# Altium footprint library 二极管封装库.PcbLib: 222 footprints (part 14 of 14)
Each footprint in its own frame and in the unit in brackets; x right, y up, seen from the top. Pads: shape width x height; smd on the part's side, far side on the other; paste and mask are expansions set on the pad; w line width, h text height; cw(c..) or ccw(c..) is an arc to the next point about the centre after c.
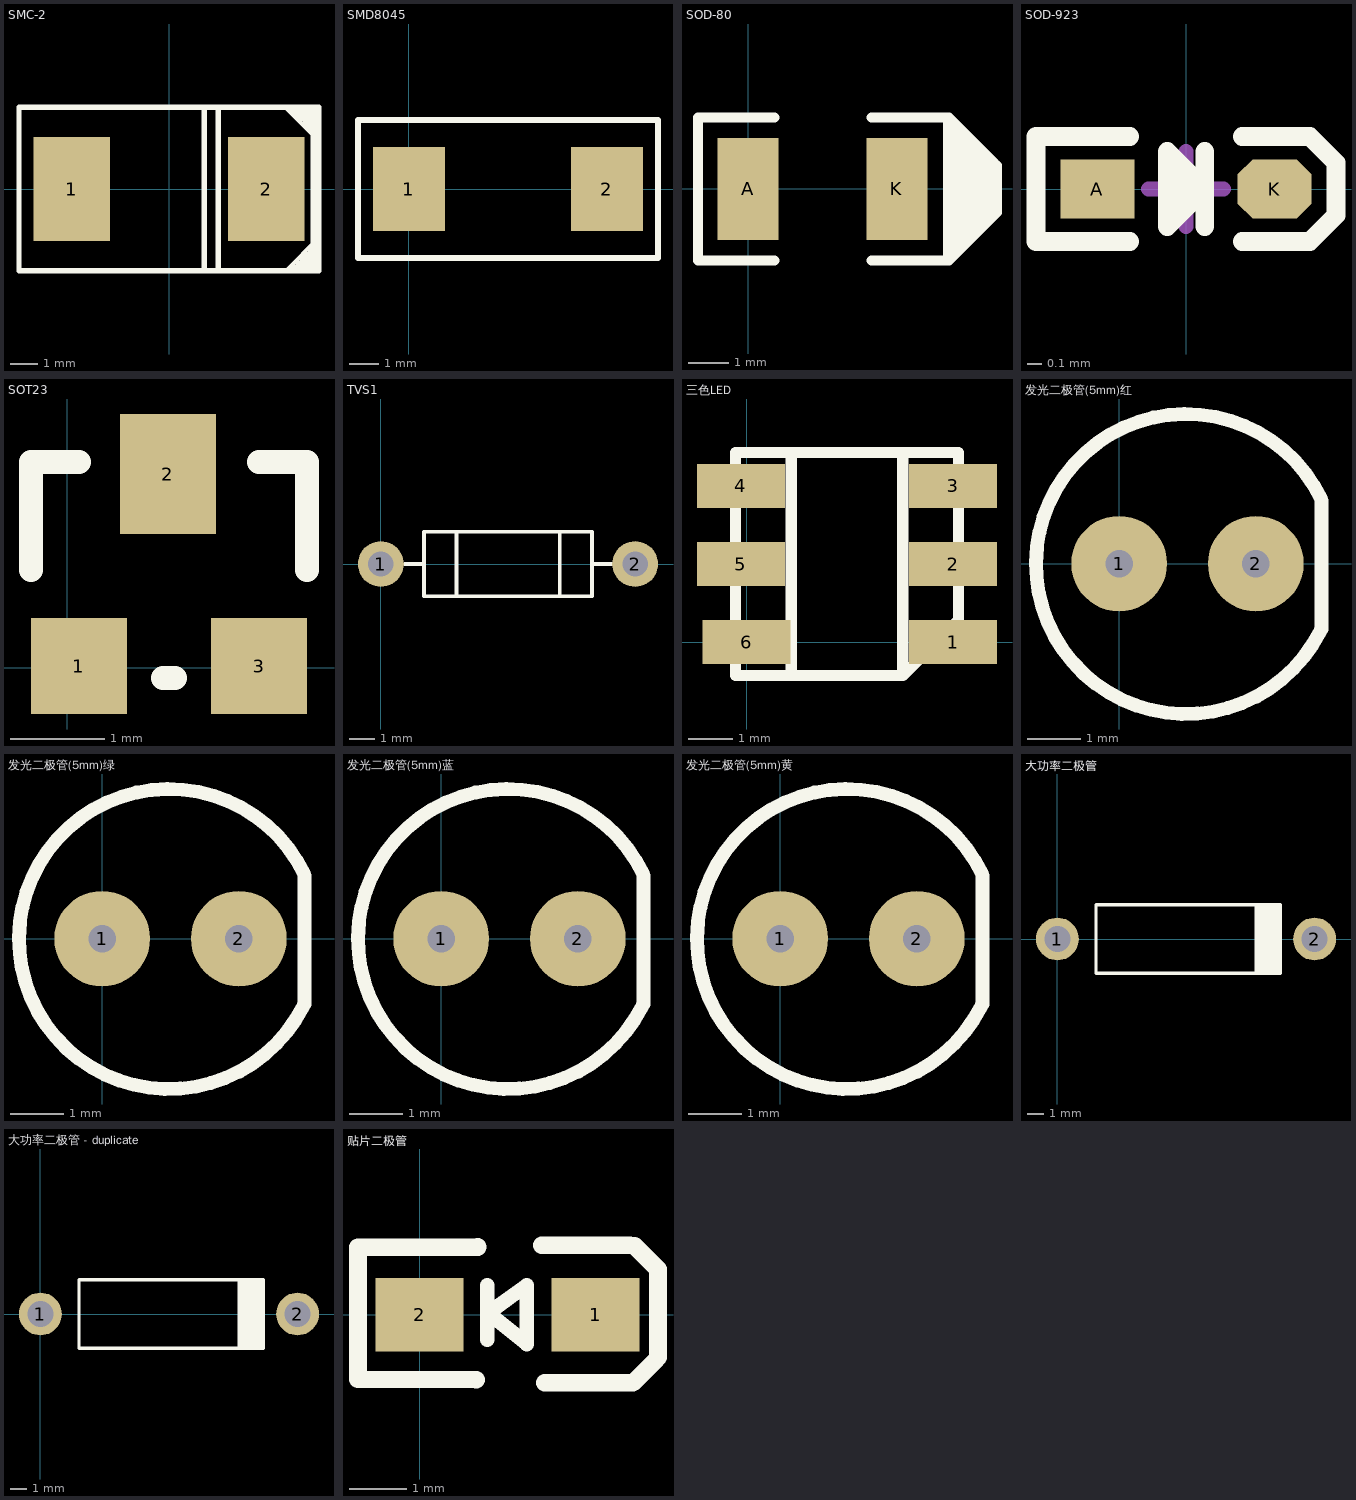
[diagram p13: the footprints below, top view; thin cyan lines are the x and y axes]

## SMC-2 [mil]
pads (2):
  rect 110x150 smd: 1(-140.49,0) 2(140.49,0)
Top Overlay:
  rectangle: 177.87,-116.5 187.76,-108.82
  rectangle: 183.14,-116.06 191.26,-103.56
  rectangle: 194.09,-100.71 204.41,-91.02
  rectangle: 189.39,-115.63 202.44,-97.3
  rectangle: 200.59,-115.63 207.05,-86.1
  rectangle: 201.77,84.37 207.28,90.51
  rectangle: 192.36,93.35 195.87,99.92
  rectangle: 195,89.17 200.47,98.62
  rectangle: 197.64,88.07 208.82,102.56
  rectangle: 182.68,100.59 191.02,110.24
  rectangle: 187.76,97.95 208.15,109.61
  rectangle: 175.43,107.4 209.69,118.11
  rectangle: 203.98,-115.63 214.53,115.08
  lines w5.91: 169.06,116.85 211.22,74.69 ; 169.29,-117.4 215.39,-71.3
  lines w7.87: 50.87,-117.64 50.87,115.98 ; 71.38,-116.53 71.38,116.46 ; -216.53,-118.11 216.53,-118.11 216.53,118.11 -216.53,118.11 -216.53,-118.11

## SMD8045 [mm]
pads (2):
  rect 2.4x2.8 smd: 1(0,0) 2(6.6,0)
Top Overlay:
  lines w0.203: -1.7,-2.3 -1.7,2.3 8.253,2.3 ; -1.653,-2.3 8.3,-2.3 8.3,2.3

## SOD-80 [mil]
pads (2):
  rect 60x100 smd: A(0,0) K(146,0)
Top Overlay:
  rectangle: 218,-38 232,40
  rectangle: 229,19 235.21,31.79
  rectangle: 226,-29 241,26
  rectangle: 205,-52 222,47
  rectangle: 205,-52 214,54
  rectangle: 196,-60 207.99,59.01
  lines w10: 26,-70 -49,-70 -49,70 26,70 ; 121,-70 196,-70 ; 121,70 196,70 ; 241,26 197,70 196,70 ; 244,23 244,-23 197,-70 196,-70 ; 196,-70 196,-67 196,-70 ; 196,-70 196,70

## SOD-923 [mm] "0.8x0.6X0.4mm（长宽高，不包括引脚）"
pads (2):
  rect 0.5x0.4 smd: A(-0.6,0)
  oct 0.5x0.4 smd: K(0.6,0)
Top Overlay:
  lines w0.127: -0.381,-0.356 -1.016,-0.356 -1.016,0.356 -0.381,0.356 ; 0,-0.127 0,0.127 -0.127,0.254 ; 0.127,-0.254 0.127,0.254 ; 0.381,-0.356 0.838,-0.356 1.016,-0.178 1.016,0.178 0.838,0.356 0.381,0.356 ; -0.127,0.254 -0.127,-0.254 0.127,0 -0.127,0.254
Mechanical 15:
  lines w0.1: -0.254,0 0.254,0 ; 0,-0.254 0,0.254
3D body "SOD-923.STEP": height 0.43, standoff 0.03, extent -0.5,-0.3 0.5,0.3

## SOT23 [mil]
pads (3):
  rect 40x40 smd: 1(4.88,0.63) 3(79.88,0.63)
  rect 40x50 smd: 2(41.88,80.63)
Top Overlay:
  lines w10: -15.12,40.63 -15.12,85.63 4.88,85.63 ; 39.88,-4.37 44.88,-4.37 ; 79.88,85.63 99.88,85.63 99.88,40.63
3D body "SOT-23-3.STEP": height 47.24, standoff 0, extent -14.87,-11.02 99.3,99.22

## TVS1 [mm]
pads (2):
  round 1.8 hole 1: 1(0,0) 2(10,0)
Top Overlay:
  lines w0.15: 0.939,0 1.701,0 ; 2.971,-1.27 2.971,1.27 ; 7.035,-1.27 7.035,1.27 ; 8.305,0 9.067,0 ; 1.701,-1.27 1.701,1.27 8.305,1.27 8.305,-1.27 1.701,-1.27
3D body "TVS.STEP": height 2.86, standoff -2.5, extent -0.397,-1.362 10.403,1.362

## 三色LED [mm]
pads (6):
  rect 2x1 smd: 1(4.699,0) 2(4.699,1.778) 3(4.699,3.556) 4(-0.127,3.556) 5(-0.127,1.778) 6(0,0)
Top Overlay:
  lines w0.254: 1.016,-0.762 1.016,4.318 ; 3.556,4.318 3.556,-0.762 ; 3.556,-0.762 4.826,0.508 4.826,4.318 -0.254,4.318 -0.254,-0.762 3.556,-0.762
3D body "User Library-smd_led_5050.step": height 1.6, standoff 0, extent -0.347,-0.697 4.953,4.303

## 发光二极管(5mm)红 [mil]
pads (2):
  round 70 hole 20: 1(0,0) 2(100,0)
Top Overlay:
  lines w10: 147.17,-49.09 cw(c48.9,-0.21) 147.99,46.99 ; 148,-48 148,46
3D body "LED5_RED.STEP": height 338.58, standoff -78.74, extent -62.2,-112.19 148.43,112.2

## 发光二极管(5mm)绿 [mil]
pads (2):
  round 70 hole 20: 1(0,0) 2(100,0)
Top Overlay:
  lines w10: 147.17,-49.09 cw(c48.9,-0.21) 147.99,46.99 ; 148,-48 148,46
3D body "LED5_GRE.STEP": height 338.58, standoff -78.74, extent -62.2,-112.19 148.43,112.2

## 发光二极管(5mm)蓝 [mil]
pads (2):
  round 70 hole 20: 1(0,0) 2(100,0)
Top Overlay:
  lines w10: 147.17,-49.09 cw(c48.9,-0.21) 147.99,46.99 ; 148,-48 148,46
3D body "LED5_BLUE.STEP": height 338.58, standoff -78.74, extent -62.2,-112.19 148.43,112.2

## 发光二极管(5mm)黄 [mil]
pads (2):
  round 70 hole 20: 1(0,0) 2(100,0)
Top Overlay:
  lines w10: 147.17,-49.09 cw(c48.9,-0.21) 147.99,46.99 ; 148,-48 148,46
3D body "LED5_YEL.STEP": height 338.58, standoff -78.74, extent -62.2,-112.19 148.43,112.2

## 大功率二极管 [mil]
pads (2):
  round 100 hole 60: 1(0,0) 2(600,0)
Top Overlay:
  rectangle: 460,-80 521.5,78.74
  lines w7.87: 90,-80 520,-80 520,80 90,80 90,-80
3D body "BYW98.STEP": height 214.33, standoff -126.22, extent -20.86,-104.32 620.87,104.34

## 大功率二极管 - duplicate [mil]
pads (2):
  round 100 hole 60: 1(0,0) 2(600,0)
Top Overlay:
  rectangle: 460,-80 521.5,78.74
  lines w7.87: 90,-80 90,80 520,80 520,-80 90,-80
3D body "BYW98.STEP": height 214.33, standoff -126.22, extent -20.86,-104.32 620.87,104.34

## 贴片二极管 [mil]
pads (2):
  rect 60x50 smd: 1(120,0) 2(0,0)
Top Overlay:
  lines w10: 46,-17 46,20 ; 47,1 73,-20 73,20 47,1
  lines w12: 38.52,-44.45 -42,-44 -42,46 39.62,46.1 ; 83.23,47.19 143.23,47.19 ; 85.37,-46.37 145.37,-46.37 ; 145.91,-46.1 160.91,-31.1 ; 146.49,46.92 161.49,31.92 ; 162.49,-29 162.49,31